# Altium footprint library En.PcbLib: 157 footprints (part 5 of 10)
Each footprint in its own frame and in the unit in brackets; x right, y up, seen from the top. Pads: shape width x height; smd on the part's side, far side on the other; paste and mask are expansions set on the pad; w line width, h text height; cw(c..) or ccw(c..) is an arc to the next point about the centre after c.
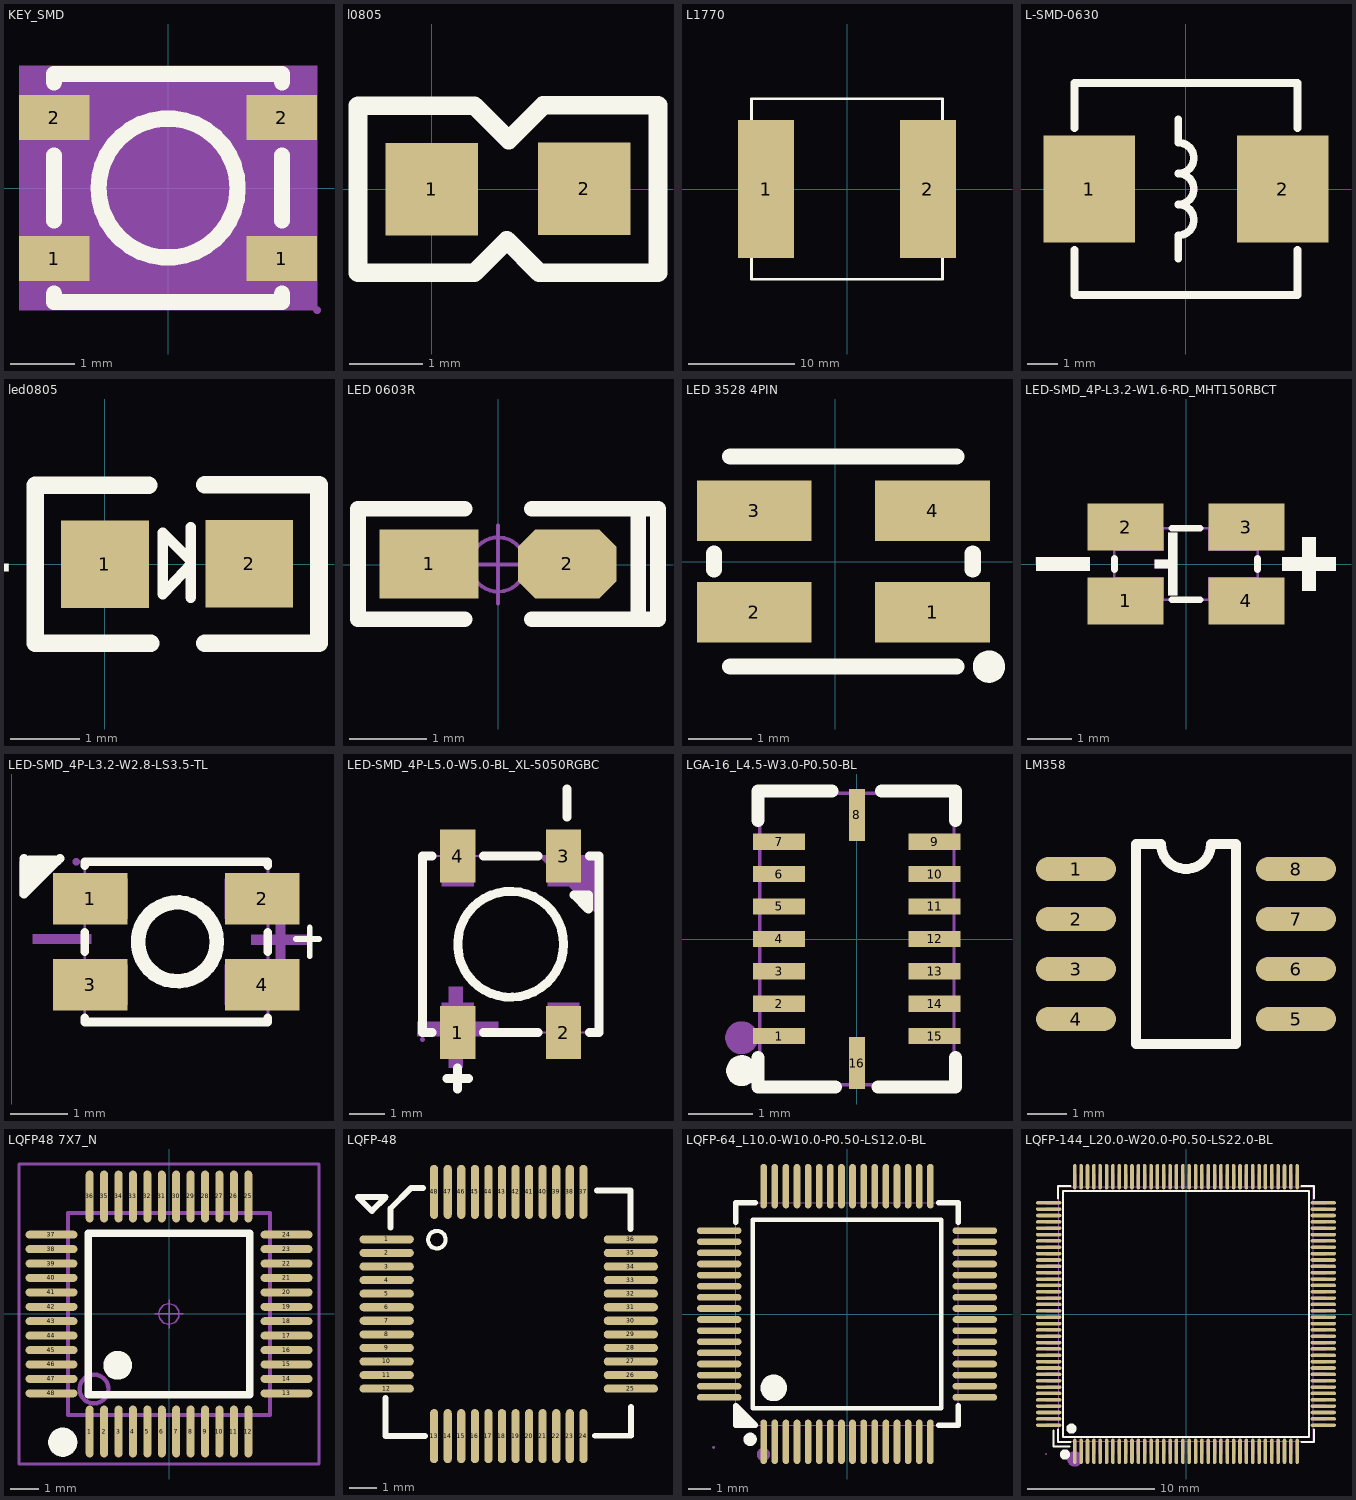
[diagram p4: the footprints below, top view; thin cyan lines are the x and y axes]

## KEY_SMD [mm]
height 3
pads (4):
  rect 1.1x0.7 smd: 1(-1.775,-1.1) 1(1.775,-1.1) 2(-1.775,1.1) 2(1.775,1.1)
Top Overlay:
  circle w0.254: c0,0 r1.085
  lines w0.254: -1.778,-1.651 -1.778,-1.778 1.778,-1.778 1.778,-1.651 ; -1.778,-0.508 -1.778,0.508 ; -1.778,1.651 -1.778,1.778 1.778,1.778 1.778,1.651 ; 1.778,-0.508 1.778,0.508
Mechanical 4:
  region: -2.325,1.905 2.325,1.905 2.325,-1.905 -2.325,-1.905
Mechanical 5:
  region: -2.325,1.45 -1.225,1.45 -1.225,0.75 -2.325,0.75
  region: 1.225,1.45 2.325,1.45 2.325,0.75 1.225,0.75
  region: -2.325,-0.75 -1.225,-0.75 -1.225,-1.45 -2.325,-1.45
  region: 1.225,-0.75 2.325,-0.75 2.325,-1.45 1.225,-1.45
Mechanical 6:
  circle w0.06: c2.325,-1.905 r0.03
Mechanical 15:
  lines w0.003: -0.011,0.478 0.04,0.529
3D body "User Library-SKSGAAE010 3_2x2_7x1_4-1.SLDPRT": height 1.6, standoff 0, extent -1.75,-1.35 1.75,1.35

## l0805 [mm]
pads (2):
  rect 1.27x1.27 smd: 1(0,0) 2(2.09,0.005)
Top Overlay:
  lines w0.254: -1.011,-1.143 0.584,-1.143 1.029,-0.699 1.473,-1.143 3.099,-1.143 3.099,1.148 1.529,1.148 1.054,0.673 0.584,1.143 -1.011,1.143 -1.011,-1.143
3D body "R0805.STEP": height 0.55, standoff 0, extent 0.036,-0.62 2.036,0.64

## L1770 [mm]
pads (2):
  rect 5.25x13 smd: 1(-7.625,0) 2(7.625,0)
Top Overlay:
  lines w0.254: -9,-6.481 -9,-8.5 9,-8.5 9,-6.481 ; -9,6.481 -9,8.5 9,8.5 9,6.481
3D body "Coilcraft-MLC1770.SLDPRT": height 6.95, standoff -0.05, extent -8.4,-8.15 8.4,8.15

## L-SMD-0630 [mm] "一体化成型电感"
height 9.4
pads (2):
  rect 3x3.5 smd: 1(-3.175,0) 2(3.175,0)
Top Overlay:
  lines w0.254: -3.658,-2.007 -3.658,-3.48 3.658,-3.48 3.658,-2.007 ; -3.658,2.007 -3.658,3.48 3.658,3.48 3.658,2.007 ; -0.254,-2.286 -0.254,-1.524 ccw(c-0.254,-1.016) -0.254,-0.508 ccw(c-0.254,0) -0.254,0.508 ccw(c-0.254,1.016) -0.254,1.524 -0.254,2.286
3D body "SMD-0630.STEP": height 3.05, standoff 0.02, extent -3.475,-3.3 3.475,3.3

## led0805 [mm] "1/8W"
pads (2):
  rect 1.27x1.27 smd: 1(0,0) 2(2.09,0.005)
Top Overlay:
  lines w0.152: 1.245,-0.483 1.245,0.533 ; 1.245,0 0.838,-0.432 0.838,0.457 1.245,0.051
  lines w0.254: 0.635,1.143 -1.011,1.143 -1.011,-1.143 0.66,-1.143 ; 1.448,-1.143 3.099,-1.143 3.099,1.148 1.448,1.148
  text "+" at -1.245,-0.483 h1.02
3D body: height 0.5, standoff 0, extent 0.051,-0.635 0.279,0.635
3D body: height 0.5, standoff 0, extent 1.803,-0.635 2.032,0.635
3D body: height 0.5, standoff 0, extent 0.279,-0.635 1.803,0.635
3D body: height 0.46, standoff 0, extent 0.774,-0.254 1.309,0.305

## LED 0603R [mil] "红色0603LED"
height 370.08
pads (2):
  rect 50x35 smd: 1(-35,0.26)
  oct 50x35 smd: 2(35,0.26)
Top Overlay:
  lines w8: -17,-27.74 -71,-27.74 -71,-25.74 -71,28.26 -70,28.26 -17,28.26 ; 17,-27.74 70,-27.74 ; 17,28.26 71,28.26 81,28.26 81,-27.74 71,-27.74 71,26.26
Mechanical 15:
  circle w1.97: c0,0 r13.78
  lines w1.97: -19.68,0 19.68,0 ; 0,-19.68 0,19.68
3D body "LED 0603玻璃罩.": height 0, standoff 0, extent 0,0 0,0
3D body "LED 0603-R.STEP": height 18.36, standoff -0.16, extent -31.5,-15.79 31.5,15.79

## LED 3528 4PIN [mm]
pads (4):
  rect 1.8x0.95 smd: 1(1.527,-0.8) 2(-1.273,-0.8) 3(-1.273,0.8) 4(1.527,0.8)
Top Overlay:
  circle w0.254: c2.413,-1.651 r0.127
  lines w0.254: -1.905,-0.127 -1.905,0.127 ; -1.651,-1.651 1.905,-1.651 ; -1.651,1.651 1.905,1.651 ; 2.159,-0.127 2.159,0.127
3D body "LED 3528 4pin.STEP": height 1.9, standoff 0, extent -1.623,-1.4 1.877,1.4

## LED-SMD_4P-L3.2-W1.6-RD_MHT150RBCT [mm]
pads (4):
  rect 1.7x1.05 smd paste+0 mask+0.05: 1(-1.35,-0.825) 2(-1.35,0.825) 3(1.35,0.825) 4(1.35,-0.825)
Top Overlay:
  region: 2.15,0.15 2.15,-0.15 3.25,-0.15 3.35,-0.15 3.35,0.15
  region: 2.6,-0.6 2.9,-0.6 2.9,0.5 2.9,0.6 2.6,0.6
  region: -2.15,-0.15 -2.15,0.15 -3.25,0.15 -3.35,0.15 -3.35,-0.15
  region: -0.7,0.1 -0.7,-0.1 -0.4,-0.1 -0.4,-0.7 -0.2,-0.7 -0.2,0.7 -0.4,0.7 -0.4,0.1
  lines w0.152: -1.6,-0.12 -1.6,0.12 ; -0.32,-0.8 0.32,-0.8 ; -0.32,0.8 0.32,0.8 ; 1.6,-0.12 1.6,0.12
Mechanical 6:
  region: 2.15,0.15 2.15,-0.15 3.25,-0.15 3.35,-0.15 3.35,0.15
  region: 2.6,-0.6 2.9,-0.6 2.9,0.5 2.9,0.6 2.6,0.6
  region: -2.15,-0.15 -2.15,0.15 -3.25,0.15 -3.35,0.15 -3.35,-0.15
  region: -0.7,0.1 -0.7,-0.1 -0.4,-0.1 -0.4,-0.7 -0.2,-0.7 -0.2,0.7 -0.4,0.7 -0.4,0.1
Mechanical 15:
  region: -1.54,-0.8 -1.541,-0.776 -1.576,-0.742 -1.624,-0.742 -1.659,-0.776 -1.66,-0.8 -1.659,-0.824 -1.624,-0.858 -1.576,-0.858 -1.541,-0.824
  region: -1.6,0.8 -0.5,0.8 -0.5,0.3 -1.6,0.3
  region: -1.6,-0.3 -0.5,-0.3 -0.5,-0.8 -1.6,-0.8
  region: 0.5,-0.3 1.6,-0.3 1.6,-0.8 0.5,-0.8
  region: 0.5,0.8 1.6,0.8 1.6,0.3 0.5,0.3
  lines w0.051: -1.6,-0.8 -1.6,0.8 1.6,0.8 1.6,-0.8 -1.6,-0.8
3D body "User Library-LED 1206 BLUE.SLDPRT": height 1.1, standoff 0, extent -1.6,-0.038 1.6,1.562
3D body "User Library-LED 1206 RED.SLDPRT": height 1.1, standoff 0, extent -1.6,-1.562 1.6,0.038

## LED-SMD_4P-L3.2-W2.8-LS3.5-TL [mm]
pads (4):
  rect 1.3x0.9 smd paste+0 mask+0.05: 1(1.375,-5.47) 2(4.375,-5.47) 3(1.375,-6.97) 4(4.375,-6.97)
Top Overlay:
  circle w0.254: c2.895,-6.22 r0.689
  region: 0.243,-5.263 0.213,-5.293 0.213,-5.391 0.243,-5.361
  region: 0.285,-5.22 0.785,-4.72 0.285,-4.72
  lines w0.1: 4.968,-6.17 5.368,-6.17 ; 5.207,-6.469 5.207,-5.969
  lines w0.152: 0.213,-4.763 0.213,-5.391 0.843,-4.763 0.785,-4.82 ; 1.275,-7.55 1.275,-7.62 4.475,-7.62 4.475,-7.55 ; 1.275,-6.39 1.275,-6.05 ; 1.275,-4.89 1.275,-4.82 4.475,-4.82 4.475,-4.89 ; 4.475,-6.39 4.475,-6.05
Mechanical 6:
  region: 0.127,-4.823 0.127,-5.423 0.727,-4.823
  region: 4.185,-6.266 4.185,-6.096 5.205,-6.096 5.205,-6.266
  region: 4.781,-6.71 4.611,-6.71 4.611,-5.69 4.781,-5.69
  region: 0.365,-6.256 0.365,-6.086 1.385,-6.086 1.385,-6.256
Mechanical 15:
  region: 1.185,-4.82 1.185,-4.795 1.15,-4.76 1.1,-4.76 1.065,-4.795 1.065,-4.82 1.065,-4.845 1.1,-4.88 1.15,-4.88 1.185,-4.845
  region: 1.125,-5.82 1.125,-5.12 2.025,-5.12 2.025,-5.82
  region: 1.125,-7.32 1.125,-6.62 2.025,-6.62 2.025,-7.32
  region: 3.725,-5.82 3.725,-5.12 4.625,-5.12 4.625,-5.82
  region: 3.725,-7.32 3.725,-6.62 4.625,-6.62 4.625,-7.32
  lines w0.051: 1.275,-7.62 4.475,-7.62 4.475,-4.82 1.275,-4.82 1.275,-7.62
3D body "User Library-KAA-3528.SLDPRT": height 1.9, standoff 0, extent 1.171,-7.623 4.671,-4.823

## LED-SMD_4P-L5.0-W5.0-BL_XL-5050RGBC [mm]
pads (4):
  rect 1x1.5 smd: 1(16.771,-17.323) 2(19.771,-17.323) 3(19.771,-12.323) 4(16.771,-12.323)
Top Overlay:
  circle w0.254: c18.271,-14.824 r1.5
  lines w0.254: 16.041,-17.324 15.771,-17.324 15.771,-12.324 16.041,-12.324 ; 16.471,-18.623 17.071,-18.623 ; 16.771,-18.923 16.771,-18.323 ; 17.501,-17.324 19.041,-17.324 ; 17.501,-12.324 19.041,-12.324 ; 19.871,-11.223 19.871,-10.423 ; 20.501,-17.324 20.771,-17.324 20.771,-12.324 20.501,-12.324 ; 20.071,-13.424 20.471,-13.824 20.471,-13.424 20.071,-13.424
Mechanical 6:
  region: 19.171,-12.323 19.071,-12.323 19.171,-12.423 20.771,-14.023 20.771,-12.323
  region: 16.521,-18.323 16.521,-16.023 16.821,-16.023 16.921,-16.023 16.921,-16.123 16.921,-18.323
  region: 15.621,-17.023 15.621,-17.423 17.921,-17.423 17.921,-17.023
Mechanical 15:
  region: 20.221,-12.123 20.221,-13.173 19.321,-13.173 19.321,-12.123
  region: 20.221,-16.473 20.221,-17.523 19.321,-17.523 19.321,-16.473
  region: 17.221,-16.473 17.221,-17.523 16.321,-17.523 16.321,-16.473
  region: 17.221,-12.123 17.221,-13.173 16.321,-13.173 16.321,-12.123
  region: 15.831,-17.523 15.831,-17.498 15.796,-17.463 15.746,-17.463 15.711,-17.498 15.711,-17.523 15.711,-17.548 15.746,-17.583 15.796,-17.583 15.831,-17.548
  lines w0.051: 15.771,-17.323 20.771,-17.323 20.771,-12.323 15.771,-12.323 15.771,-17.323
3D body "User Library-ws2812B-1.SLDPRT": height 1.54, standoff -0.03, extent 15.788,-17.559 20.788,-12.159

## LGA-16_L4.5-W3.0-P0.50-BL [mm]
pads (16):
  rect 0.8x0.25 smd: 1(-1.2,-1.498) 2(-1.2,-0.998) 3(-1.2,-0.498) 4(-1.2,0.002) 5(-1.2,0.502) 6(-1.2,1.002) 7(-1.2,1.502) 9(1.2,1.502) 10(1.2,1.002) 11(1.2,0.502) 12(1.2,0.002) 13(1.2,-0.498) 14(1.2,-0.998) 15(1.2,-1.498)
  rect 0.25x0.8 smd: 8(0,1.915) 16(0,-1.915)
Top Overlay:
  circle w0.254: c-1.778,-2.032 r0.112
  lines w0.2: -1.524,-1.827 -1.524,-2.286 -0.329,-2.286 ; -1.524,1.831 -1.524,2.159 -1.524,2.286 -0.381,2.286 ; 0.329,-2.286 1.524,-2.286 1.524,-1.827 ; 0.381,2.286 1.524,2.286 1.524,1.831
Mechanical 6:
  circle w0.254: c-1.778,-1.524 r0.127
Mechanical 15:
  region: -1.44,-2.25 -1.441,-2.225 -1.476,-2.191 -1.525,-2.191 -1.56,-2.225 -1.56,-2.25 -1.56,-2.274 -1.525,-2.309 -1.476,-2.309 -1.441,-2.274
  region: -0.9,-1.398 -0.9,-1.598 -1.4,-1.598 -1.4,-1.398
  region: -0.9,-0.898 -0.9,-1.098 -1.4,-1.098 -1.4,-0.898
  region: -0.9,-0.398 -0.9,-0.598 -1.4,-0.598 -1.4,-0.398
  region: -0.9,0.102 -0.9,-0.098 -1.4,-0.098 -1.4,0.102
  region: -0.9,0.602 -0.9,0.402 -1.4,0.402 -1.4,0.602
  region: -0.9,1.102 -0.9,0.902 -1.4,0.902 -1.4,1.102
  region: -0.9,1.602 -0.9,1.402 -1.4,1.402 -1.4,1.602
  region: 0.1,1.65 -0.1,1.65 -0.1,2.15 0.1,2.15
  region: 0.9,1.402 0.9,1.602 1.4,1.602 1.4,1.402
  region: 0.9,0.902 0.9,1.102 1.4,1.102 1.4,0.902
  region: 0.9,0.402 0.9,0.602 1.4,0.602 1.4,0.402
  region: 0.9,-0.098 0.9,0.102 1.4,0.102 1.4,-0.098
  region: 0.9,-0.598 0.9,-0.398 1.4,-0.398 1.4,-0.598
  region: 0.9,-1.098 0.9,-0.898 1.4,-0.898 1.4,-1.098
  region: 0.9,-1.598 0.9,-1.398 1.4,-1.398 1.4,-1.598
  region: -0.1,-1.65 0.1,-1.65 0.1,-2.15 -0.1,-2.15
  lines w0.051: -1.5,-2.25 -1.5,2.25 1.5,2.25 1.5,-2.25 -1.5,-2.25
3D body "User Library-16-LGA.SLDPRT": height -0.37, standoff -1.33, extent -1.5,-2.25 1.5,2.25

## LM358 [mil]
pads (8):
  oval 80x24 smd: 1(374,-571) 2(374,-621) 3(374,-671) 4(374,-721) 5(594,-721) 6(594,-671) 7(594,-621) 8(594,-571)
Top Overlay:
  lines w10: 434,-746 534,-746 534,-546 509,-546 cw(c484,-546) 459,-546 434,-546 434,-746
3D body "SOP8.STEP": height 62.99, standoff 0, extent 366.3,-743.62 604.17,-545.98

## LQFP48 7X7_N [mm] "48脚，体宽7x7mm，脚距0.5mm"
height 1.6
pads (48):
  oval 0.279x1.8 smd: 1(-2.75,-4.075) 2(-2.25,-4.075) 3(-1.75,-4.075) 4(-1.25,-4.075) 5(-0.75,-4.075) 6(-0.25,-4.075) 7(0.25,-4.075) 8(0.75,-4.075) 9(1.25,-4.075) 10(1.75,-4.075) 11(2.25,-4.075) 12(2.75,-4.075) 25(2.75,4.075) 26(2.25,4.075) 27(1.75,4.075) 28(1.25,4.075) 29(0.75,4.075) 30(0.25,4.075) 31(-0.25,4.075) 32(-0.75,4.075) 33(-1.25,4.075) 34(-1.75,4.075) 35(-2.25,4.075) 36(-2.75,4.075)
  oval 1.8x0.279 smd: 13(4.075,-2.75) 14(4.075,-2.25) 15(4.075,-1.75) 16(4.075,-1.25) 17(4.075,-0.75) 18(4.075,-0.25) 19(4.075,0.25) 20(4.075,0.75) 21(4.075,1.25) 22(4.075,1.75) 23(4.075,2.25) 24(4.075,2.75) 37(-4.075,2.75) 38(-4.075,2.25) 39(-4.075,1.75) 40(-4.075,1.25) 41(-4.075,0.75) 42(-4.075,0.25) 43(-4.075,-0.25) 44(-4.075,-0.75) 45(-4.075,-1.25) 46(-4.075,-1.75) 47(-4.075,-2.25) 48(-4.075,-2.75)
Top Overlay:
  circle w0.5: c-1.778,-1.778 r0.25
  circle w0.508: c-3.683,-4.445 r0.25
  lines w0.254: -2.794,-2.794 2.794,-2.794 2.794,2.794 -2.794,2.794 -2.794,-2.794
Mechanical 13:
  circle w0.15: c-2.6,-2.6 r0.5
  lines w0.15: -3.5,-3.5 -3.5,3.5 3.5,3.5 3.5,-3.5 -3.5,-3.5
Mechanical 15:
  circle w0.05: c0,0 r0.35
  lines w0.05: -0.5,0 0.5,0 ; 0,-0.5 0,0.5
  lines w0.1: -5.2,-5.2 5.2,-5.2 5.2,5.2 -5.2,5.2 -5.2,-5.2
3D body "LQFP48-7x7.STEP": height 1.45, standoff 0, extent -4.503,-4.503 4.503,4.503

## LQFP-48 [mm]
pads (48):
  oval 2x0.3 smd: 1(23.567,-34.461) 2(23.567,-34.961) 3(23.567,-35.461) 4(23.567,-35.961) 5(23.567,-36.461) 6(23.567,-36.961) 7(23.567,-37.461) 8(23.567,-37.961) 9(23.567,-38.461) 10(23.567,-38.961) 11(23.567,-39.461) 12(23.567,-39.961) 25(32.567,-39.961) 26(32.567,-39.461) 27(32.567,-38.961) 28(32.567,-38.461) 29(32.567,-37.961) 30(32.567,-37.461) 31(32.567,-36.961) 32(32.567,-36.461) 33(32.567,-35.961) 34(32.567,-35.461) 35(32.567,-34.961) 36(32.567,-34.461)
  oval 0.3x2 smd: 13(25.317,-41.711) 14(25.817,-41.711) 15(26.317,-41.711) 16(26.817,-41.711) 17(27.317,-41.711) 18(27.817,-41.711) 19(28.317,-41.711) 20(28.817,-41.711) 21(29.317,-41.711) 22(29.817,-41.711) 23(30.317,-41.711) 24(30.817,-41.711) 37(30.817,-32.711) 38(30.317,-32.711) 39(29.817,-32.711) 40(29.317,-32.711) 41(28.817,-32.711) 42(28.317,-32.711) 43(27.817,-32.711) 44(27.317,-32.711) 45(26.817,-32.711) 46(26.317,-32.711) 47(25.817,-32.711) 48(25.317,-32.711)
Top Overlay:
  circle w0.15: c25.418,-34.472 r0.324
  lines w0.22: 23.516,-40.31 23.516,-41.708 24.976,-41.708 ; 23.71,-34.017 23.71,-33.322 24.458,-32.574 24.915,-32.574 ; 31.242,-41.698 32.565,-41.698 32.565,-40.63 ; 31.323,-32.658 32.556,-32.658 32.556,-34.073 ; 22.511,-32.907 23.019,-33.415 23.527,-32.907 22.511,-32.907
3D body "LQFP48-7x7.STEP": height 1.45, standoff 0, extent 23.564,-41.714 32.57,-32.708

## LQFP-64_L10.0-W10.0-P0.50-LS12.0-BL [mm]
pads (64):
  oval 0.3x2 smd: 1(-3.75,-5.75) 2(-3.25,-5.75) 3(-2.75,-5.75) 4(-2.25,-5.75) 5(-1.75,-5.75) 6(-1.25,-5.75) 7(-0.75,-5.75) 8(-0.25,-5.75) 9(0.25,-5.75) 10(0.75,-5.75) 11(1.25,-5.75) 12(1.75,-5.75) 13(2.25,-5.75) 14(2.75,-5.75) 15(3.25,-5.75) 16(3.75,-5.75) 33(3.75,5.75) 34(3.25,5.75) 35(2.75,5.75) 36(2.25,5.75) 37(1.75,5.75) 38(1.25,5.75) 39(0.75,5.75) 40(0.25,5.75) 41(-0.25,5.75) 42(-0.75,5.75) 43(-1.25,5.75) 44(-1.75,5.75) 45(-2.25,5.75) 46(-2.75,5.75) 47(-3.25,5.75) 48(-3.75,5.75)
  oval 2x0.3 smd: 17(5.75,-3.75) 18(5.75,-3.25) 19(5.75,-2.75) 20(5.75,-2.25) 21(5.75,-1.75) 22(5.75,-1.25) 23(5.75,-0.75) 24(5.75,-0.25) 25(5.75,0.25) 26(5.75,0.75) 27(5.75,1.25) 28(5.75,1.75) 29(5.75,2.25) 30(5.75,2.75) 31(5.75,3.25) 32(5.75,3.75) 49(-5.75,3.75) 50(-5.75,3.25) 51(-5.75,2.75) 52(-5.75,2.25) 53(-5.75,1.75) 54(-5.75,1.25) 55(-5.75,0.75) 56(-5.75,0.25) 57(-5.75,-0.25) 58(-5.75,-0.75) 59(-5.75,-1.25) 60(-5.75,-1.75) 61(-5.75,-2.25) 62(-5.75,-2.75) 63(-5.75,-3.25) 64(-5.75,-3.75)
Top Overlay:
  region: -4.131,-5 -5,-4.131 -5,-5
  lines w0.2: -4.25,-4.25 -4.25,4.25 4.25,4.25 4.25,-4.25 -4.25,-4.25
  lines w0.254: -5,4.131 -5,5 -4.131,5 ; 4.131,-5 5,-5 5,-4.131 ; 4.131,5 5,5 5,4.131 ; -5,-4.131 -5,-4.131 ; -5,-4.131 -4.131,-5 -5,-5 -5,-4.131
  lines w0.3: -4.361,-5.49 ccw(c-4.36,-5.64) -4.36,-5.79 ccw(c-4.36,-5.64) -4.359,-5.49
  lines w0.6: -3.299,-3.025 ccw(c-3.297,-3.325) -3.297,-3.625 ccw(c-3.297,-3.325) -3.294,-3.025
Mechanical 6:
  circle w0.3: c-3.76,-6.32 r0.15
Mechanical 15:
  drawing of 133 lines, arcs and shapes, not listed
3D body "stm32f205ret6tr.step": height 1.45, standoff 0, extent -6.003,-6.003 6.003,6.003

## LQFP-144_L20.0-W20.0-P0.50-LS22.0-BL [mm]
pads (144):
  oval 0.28x2 smd: 1(-8.75,-10.8) 2(-8.25,-10.8) 3(-7.75,-10.8) 4(-7.25,-10.8) 5(-6.75,-10.8) 6(-6.25,-10.8) 7(-5.75,-10.8) 8(-5.25,-10.8) 9(-4.75,-10.8) 10(-4.25,-10.8) 11(-3.75,-10.8) 12(-3.25,-10.8) 13(-2.75,-10.8) 14(-2.25,-10.8) 15(-1.75,-10.8) 16(-1.25,-10.8) 17(-0.75,-10.8) 18(-0.25,-10.8) 19(0.25,-10.8) 20(0.75,-10.8) 21(1.25,-10.8) 22(1.75,-10.8) 23(2.25,-10.8) 24(2.75,-10.8) 25(3.25,-10.8) 26(3.75,-10.8) 27(4.25,-10.8) 28(4.75,-10.8) 29(5.25,-10.8) 30(5.75,-10.8) 31(6.25,-10.8) 32(6.75,-10.8) 33(7.25,-10.8) 34(7.75,-10.8) 35(8.25,-10.8) 36(8.75,-10.8) 73(8.75,10.8) 74(8.25,10.8) 75(7.75,10.8) 76(7.25,10.8) 77(6.75,10.8) 78(6.25,10.8) 79(5.75,10.8) 80(5.25,10.8) 81(4.75,10.8) 82(4.25,10.8) 83(3.75,10.8) 84(3.25,10.8) 85(2.75,10.8) 86(2.25,10.8) 87(1.75,10.8) 88(1.25,10.8) 89(0.75,10.8) 90(0.25,10.8) 91(-0.25,10.8) 92(-0.75,10.8) 93(-1.25,10.8) 94(-1.75,10.8) 95(-2.25,10.8) 96(-2.75,10.8) 97(-3.25,10.8) 98(-3.75,10.8) 99(-4.25,10.8) 100(-4.75,10.8) 101(-5.25,10.8) 102(-5.75,10.8) 103(-6.25,10.8) 104(-6.75,10.8) 105(-7.25,10.8) 106(-7.75,10.8) 107(-8.25,10.8) 108(-8.75,10.8)
  oval 2x0.28 smd: 37(10.8,-8.75) 38(10.8,-8.25) 39(10.8,-7.75) 40(10.8,-7.25) 41(10.8,-6.75) 42(10.8,-6.25) 43(10.8,-5.75) 44(10.8,-5.25) 45(10.8,-4.75) 46(10.8,-4.25) 47(10.8,-3.75) 48(10.8,-3.25) 49(10.8,-2.75) 50(10.8,-2.25) 51(10.8,-1.75) 52(10.8,-1.25) 53(10.8,-0.75) 54(10.8,-0.25) 55(10.8,0.25) 56(10.8,0.75) 57(10.8,1.25) 58(10.8,1.75) 59(10.8,2.25) 60(10.8,2.75) 61(10.8,3.25) 62(10.8,3.75) 63(10.8,4.25) 64(10.8,4.75) 65(10.8,5.25) 66(10.8,5.75) 67(10.8,6.25) 68(10.8,6.75) 69(10.8,7.25) 70(10.8,7.75) 71(10.8,8.25) 72(10.8,8.75) 109(-10.8,8.75) 110(-10.8,8.25) 111(-10.8,7.75) 112(-10.8,7.25) 113(-10.8,6.75) 114(-10.8,6.25) 115(-10.8,5.75) 116(-10.8,5.25) 117(-10.8,4.75) 118(-10.8,4.25) 119(-10.8,3.75) 120(-10.8,3.25) 121(-10.8,2.75) 122(-10.8,2.25) 123(-10.8,1.75) 124(-10.8,1.25) 125(-10.8,0.75) 126(-10.8,0.25) 127(-10.8,-0.25) 128(-10.8,-0.75) 129(-10.8,-1.25) 130(-10.8,-1.75) 131(-10.8,-2.25) 132(-10.8,-2.75) 133(-10.8,-3.25) 134(-10.8,-3.75) 135(-10.8,-4.25) 136(-10.8,-4.75) 137(-10.8,-5.25) 138(-10.8,-5.75) 139(-10.8,-6.25) 140(-10.8,-6.75) 141(-10.8,-7.25) 142(-10.8,-7.75) 143(-10.8,-8.25) 144(-10.8,-8.75)
Top Overlay:
  circle w0.4: c-9.017,-9.017 r0.2
  circle w0.4: c-9.525,-11.049 r0.2
  lines w0.152: -10.414,-9.144 -10.414,-10.414 -9.144,-10.414 ; -10.076,-9.081 -10.076,-10.076 -9.08,-10.076 ; -10.076,9.08 -10.076,10.076 -9.08,10.076 ; 9.081,-10.076 10.076,-10.076 10.076,-9.081 ; 9.081,10.076 10.076,10.076 10.076,9.08 ; -9.671,-9.671 9.671,-9.671 9.671,9.671 -9.671,9.671 -9.671,-9.671
Mechanical 6:
  circle w0.6: c-8.75,-11.4 r0.3
Mechanical 15:
  drawing of 293 lines, arcs and shapes, not listed
3D body "User Library-STM32H753ZGT6.SLDPRT": height 1.6, standoff 0, extent -11.075,-11.075 11.075,11.075